# Altium footprint library Elettronica FM.PcbLib: 387 footprints (part 14 of 25)
Each footprint in its own frame and in the unit in brackets; x right, y up, seen from the top. Pads: shape width x height; smd on the part's side, far side on the other; paste and mask are expansions set on the pad; w line width, h text height; cw(c..) or ccw(c..) is an arc to the next point about the centre after c.
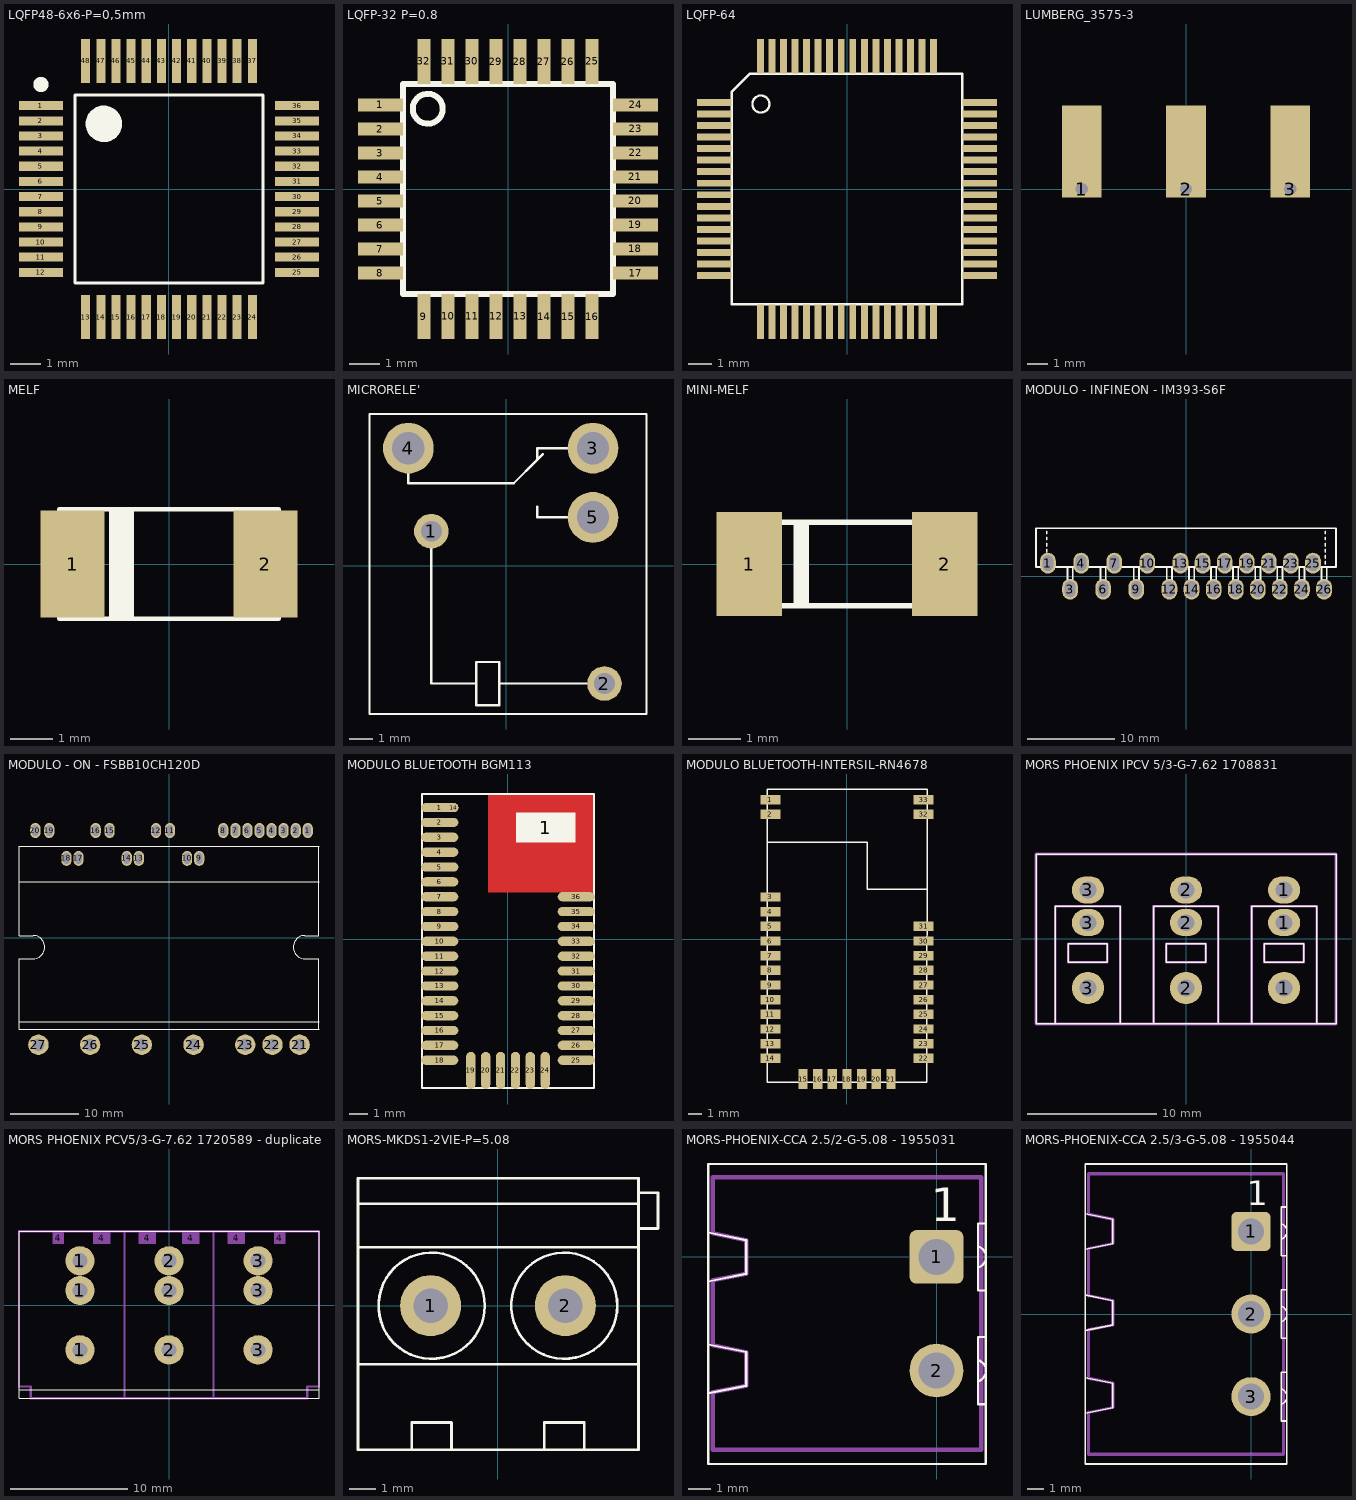
[diagram p13: the footprints below, top view; thin cyan lines are the x and y axes]

## LQFP48-6x6-P=0,5mm [mm] "QFP, 48-Leads, Body 7,00x7,00mm, Pitch 0,50mm, IPC Medium Density"
height 1.7
pads (48):
  rect 1.45x0.3 smd: 1(-4.225,2.75) 2(-4.225,2.25) 3(-4.225,1.75) 4(-4.225,1.25) 5(-4.225,0.75) 6(-4.225,0.25) 7(-4.225,-0.25) 8(-4.225,-0.75) 9(-4.225,-1.25) 10(-4.225,-1.75) 11(-4.225,-2.25) 12(-4.225,-2.75) 25(4.225,-2.75) 26(4.225,-2.25) 27(4.225,-1.75) 28(4.225,-1.25) 29(4.225,-0.75) 30(4.225,-0.25) 31(4.225,0.25) 32(4.225,0.75) 33(4.225,1.25) 34(4.225,1.75) 35(4.225,2.25) 36(4.225,2.75)
  rect 0.3x1.45 smd: 13(-2.75,-4.225) 14(-2.25,-4.225) 15(-1.75,-4.225) 16(-1.25,-4.225) 17(-0.75,-4.225) 18(-0.25,-4.225) 19(0.25,-4.225) 20(0.75,-4.225) 21(1.25,-4.225) 22(1.75,-4.225) 23(2.25,-4.225) 24(2.75,-4.225) 37(2.75,4.225) 38(2.25,4.225) 39(1.75,4.225) 40(1.25,4.225) 41(0.75,4.225) 42(0.25,4.225) 43(-0.25,4.225) 44(-0.75,4.225) 45(-1.25,4.225) 46(-1.75,4.225) 47(-2.25,4.225) 48(-2.75,4.225)
Top Overlay:
  circle w0.6: c-2.15,2.15 r0.3
  circle w0.25: c-4.225,3.45 r0.125
  lines w0.1: -3.1,-3.1 -3.1,3.1 3.1,3.1 3.1,-3.1 -3.1,-3.1
3D body: height 1.7, standoff 0.2, extent -3.5,-3.5 3.5,3.5
3D body "QFP50P900X900X160-48N.STEP": height 1.75, standoff 0, extent -4.514,-4.514 4.514,4.514

## LQFP-32 P=0.8 [mm]
height 1.9
pads (32):
  rect 1.5x0.44 smd: 1(-4.25,2.8) 2(-4.25,2) 3(-4.25,1.2) 4(-4.25,0.4) 5(-4.25,-0.4) 6(-4.25,-1.2) 7(-4.25,-2) 8(-4.25,-2.8) 17(4.25,-2.8) 18(4.25,-2) 19(4.25,-1.2) 20(4.25,-0.4) 21(4.25,0.4) 22(4.25,1.2) 23(4.25,2) 24(4.25,2.8)
  rect 0.44x1.5 smd: 9(-2.8,-4.25) 10(-2,-4.25) 11(-1.2,-4.25) 12(-0.4,-4.25) 13(0.4,-4.25) 14(1.2,-4.25) 15(2,-4.25) 16(2.8,-4.25) 25(2.8,4.25) 26(2,4.25) 27(1.2,4.25) 28(0.4,4.25) 29(-0.4,4.25) 30(-1.2,4.25) 31(-2,4.25) 32(-2.8,4.25)
Top Overlay:
  circle w0.2: c-2.675,2.675 r0.5
  lines w0.2: -3.5,-3.5 3.5,-3.5 3.5,3.5 -3.5,3.5 -3.5,-3.5
3D body: height 1.6, standoff 0, extent -3.5,-3.5 3.5,3.5

## LQFP-64 [mm]
pads (64):
  rect 1.5x0.3 smd mask+0.1: 1(-5.75,3.75) 2(-5.75,3.25) 3(-5.75,2.75) 4(-5.75,2.25) 5(-5.75,1.75) 6(-5.75,1.25) 7(-5.75,0.75) 8(-5.75,0.25) 9(-5.75,-0.25) 10(-5.75,-0.75) 11(-5.75,-1.25) 12(-5.75,-1.75) 13(-5.75,-2.25) 14(-5.75,-2.75) 15(-5.75,-3.25) 16(-5.75,-3.75) 33(5.75,-3.75) 34(5.75,-3.25) 35(5.75,-2.75) 36(5.75,-2.25) 37(5.75,-1.75) 38(5.75,-1.25) 39(5.75,-0.75) 40(5.75,-0.25) 41(5.75,0.25) 42(5.75,0.75) 43(5.75,1.25) 44(5.75,1.75) 45(5.75,2.25) 46(5.75,2.75) 47(5.75,3.25) 48(5.75,3.75)
  rect 0.3x1.5 smd mask+0.1: 17(-3.75,-5.75) 18(-3.25,-5.75) 19(-2.75,-5.75) 20(-2.25,-5.75) 21(-1.75,-5.75) 22(-1.25,-5.75) 23(-0.75,-5.75) 24(-0.25,-5.75) 25(0.25,-5.75) 26(0.75,-5.75) 27(1.25,-5.75) 28(1.75,-5.75) 29(2.25,-5.75) 30(2.75,-5.75) 31(3.25,-5.75) 32(3.75,-5.75) 49(3.75,5.75) 50(3.25,5.75) 51(2.75,5.75) 52(2.25,5.75) 53(1.75,5.75) 54(1.25,5.75) 55(0.75,5.75) 56(0.25,5.75) 57(-0.25,5.75) 58(-0.75,5.75) 59(-1.25,5.75) 60(-1.75,5.75) 61(-2.25,5.75) 62(-2.75,5.75) 63(-3.25,5.75) 64(-3.75,5.75)
Top Overlay:
  circle w0.1: c-3.731,3.681 r0.37
  lines w0.1: -5,-5 -5,4.2 -4.2,5 5,5 5,-5 -5,-5
3D body "TQFP-64.stp": height 1.6, standoff 0, extent -5.9,-5.9 5.9,5.9

## LUMBERG_3575-3 [mm]
pads (3):
  rect 1.9x4.4 hole 0.6 copper offset 0,1.8: 1(-5,0) 2(0,0) 3(5,0)
3D body "lumberg_3575_07.stp": height 7.21, standoff -2.59, extent -7.379,-1.475 27.521,13.525

## MELF [mil]
pads (2):
  rect 60x100 smd: 1(-90,0) 2(90,0)
Top Overlay:
  lines w3.94: -80.71,-51.18 -80.71,51.18 ; 80.71,-51.18 80.71,51.18 ; -102.36,-51.18 102.36,-51.18 102.36,51.18 -102.36,51.18 -102.36,-51.18
  lines w7.87: -52.17,-49.21 -52.17,49.21 ; -44.29,-49.21 -44.29,49.21 ; -36.42,-49.21 -36.42,49.21
3D body: height 51.08, standoff -51.08, extent -102.36,-50.77 102.36,51.19
3D body: height 51.47, standoff -51.47, extent -56.1,-51.37 -32.48,51.37

## MICRORELE' [mm]
height 16
pads (5):
  round 1.5 hole 0.9 mask+0.1: 1(-3.25,1.5) 2(4.25,-5.1)
  round 2.2 hole 1.4 mask+0.1: 3(3.75,5.1) 4(-4.25,5.1) 5(3.75,2.1)
Top Overlay:
  lines w0.1: -4.25,5.1 -4.25,3.58 0.32,3.58 1.332,4.593 ; -3.25,0.755 -3.25,-5.1 -1.312,-5.1 ; -0.298,-5.1 3.495,-5.1 ; 1.332,2.568 1.332,2.1 3.75,2.1 ; 1.57,4.83 1.332,4.593 ; 3.75,5.1 1.332,5.1 1.332,4.593 ; 1.332,4.593 1.332,4.593 ; -5.93,-6.42 -5.93,6.58 6.07,6.58 6.07,-6.42 -5.93,-6.42 ; -1.305,-6.045 -0.305,-6.045 -0.305,-4.17 -1.305,-4.17 -1.305,-6.045
3D body "c-1393280-6-b1-3d.stp": height 9.9, standoff -2.8, extent -5.93,-6.42 6.07,6.58

## MINI-MELF [mm]
pads (2):
  rect 1.25x2 smd: 1(-1.875,0) 2(1.875,0)
Top Overlay:
  lines w0.1: -0.975,-0.8 -0.975,0.8 ; -0.875,-0.8 -0.875,0.8 ; -0.775,-0.8 -0.775,0.8 ; -1.85,-0.8 1.85,-0.8 1.85,0.8 -1.85,0.8 -1.85,-0.8
3D body: height 1.6, standoff 0, extent -1.85,-0.794 1.85,0.8

## MODULO - INFINEON - IM393-S6F [mm]
height 1.9
pads (22):
  oval 1.8x2.4 hole 1.2 slot 1.8 at 90 deg paste-0.025 mask+0.1: 1(-15.875,1.5) 3(-13.335,-1.5) 4(-12.065,1.5) 6(-9.525,-1.5) 7(-8.255,1.5) 9(-5.715,-1.5) 10(-4.445,1.5) 12(-1.905,-1.5) 13(-0.635,1.5) 14(0.635,-1.5) 15(1.905,1.5) 16(3.175,-1.5) 17(4.445,1.5) 18(5.715,-1.5) 19(6.985,1.5) 20(8.255,-1.5) 21(9.525,1.5) 22(10.795,-1.5) 23(12.065,1.5) 24(13.335,-1.5) 25(14.605,1.5) 26(15.875,-1.5)
Top Overlay:
  lines w0.2: -16,1.375 -16,1.675 ; -16,2.075 -16,2.375 ; -16,2.775 -16,3.075 ; -16,3.475 -16,3.775 ; -16,4.175 -16,4.475 ; -16,4.875 -16,5.175 ; -13.635,1.025 -13.635,-1.75 -13.035,-1.75 -13.035,1.025 ; -9.825,1.025 -9.825,-1.75 -9.225,-1.75 -9.225,1.025 ; -6.015,1.025 -6.015,-1.75 -5.415,-1.75 -5.415,1.025 ; -2.205,1.025 -2.205,-1.75 -1.605,-1.75 -1.605,1.025 ; 0.335,1.025 0.335,-1.75 0.935,-1.75 0.935,1.025 ; 2.875,1.025 2.875,-1.75 3.475,-1.75 3.475,1.025 ; 5.415,1.025 5.415,-1.75 6.015,-1.75 6.015,1.025 ; 7.955,1.025 7.955,-1.75 8.555,-1.75 8.555,1.025 ; 10.495,1.025 10.495,-1.75 11.095,-1.75 11.095,1.025 ; 13.035,1.025 13.035,-1.75 13.635,-1.75 13.635,1.025 ; 15.575,1.025 15.575,-1.75 16.175,-1.75 16.175,1.025 ; 16,1.375 16,1.675 ; 16,2.075 16,2.375 ; 16,2.775 16,3.075 ; 16,3.475 16,3.775 ; 16,4.175 16,4.475 ; 16,4.875 16,5.175 ; -17.25,1.05 -17.25,5.5 17.25,5.5 17.25,1.05 -17.25,1.05
3D body: height 19, standoff 4, extent -17.25,1.05 17.25,5.5

## MODULO - ON - FSBB10CH120D [mm]
height 1.9
pads (27):
  oval 1.5x2.2 hole 0.9 slot 1.6 at 90 deg paste-0.025 mask+0.075: 1(20.447,15.78) 2(18.669,15.78) 3(16.891,15.78) 4(15.113,15.78) 5(13.335,15.78) 6(11.557,15.78) 7(9.779,15.78) 8(8.001,15.78) 9(4.445,11.68) 10(2.667,11.68) 11(0.136,15.78) 12(-1.914,15.78) 13(-4.445,11.68) 14(-6.223,11.68) 15(-8.754,15.78) 16(-10.804,15.78) 17(-13.335,11.68) 18(-15.113,11.68) 19(-17.644,15.78) 20(-19.694,15.78)
  round 3 hole 1.8 paste-0.025 mask+0.075: 21(19.24,-15.78) 22(15.24,-15.78) 23(11.24,-15.78) 24(3.62,-15.78) 25(-4,-15.78) 26(-11.62,-15.78) 27(-19.24,-15.78)
Top Overlay:
  lines w0.1: -22.1,-12.4 22.1,-12.4 ; -22.1,8.2 22.1,8.2 ; -22.1,-13.5 22.1,-13.5 22.1,-3.1 20,-3.1 cw(c20,-1.4) 20,0.3 22.1,0.3 22.1,13.5 -22.1,13.5 -22.1,0.3 -20,0.3 cw(c-20,-1.4) -20,-3.1 -22.1,-3.1 -22.1,-13.5
3D body: height 7.51, standoff 7.49, extent -17.3,-10.4 17.3,2.6
3D body: height 5.6, standoff 1.8, extent -22.1,-13.5 22.1,13.5
3D body: height 7.5, standoff 1.8, extent -22.1,-12.4 22.1,8.2

## MODULO BLUETOOTH BGM113 [mm]
pads (38):
  oval 2x0.5 smd mask+0.1: 1(-3.675,7.075) 2(-3.675,6.275) 3(-3.675,5.475) 4(-3.675,4.675) 5(-3.675,3.875) 6(-3.675,3.075) 7(-3.675,2.275) 8(-3.675,1.475) 9(-3.675,0.675) 10(-3.675,-0.125) 11(-3.675,-0.925) 12(-3.675,-1.725) 13(-3.675,-2.525) 14(-3.675,-3.325) 15(-3.675,-4.125) 16(-3.675,-4.925) 17(-3.675,-5.725) 18(-3.675,-6.525) 25(3.675,-6.525) 26(3.675,-5.725) 27(3.675,-4.925) 28(3.675,-4.125) 29(3.675,-3.325) 30(3.675,-2.525) 31(3.675,-1.725) 32(3.675,-0.925) 33(3.675,-0.125) 34(3.675,0.675) 35(3.675,1.475) 36(3.675,2.275)
  rect 3.2x1.6 on Top Overlay mask+0.1: 1(2.025,6)
  round 0.5 on Top Overlay mask+0.1: 14(-2.925,7.075)
  oval 0.5x2 smd mask+0.1: 19(-2,-7.075) 20(-1.2,-7.075) 21(-0.4,-7.075) 22(0.4,-7.075) 23(1.2,-7.075) 24(2,-7.075)
Top Layer:
  pour cut-out: -1.075,7.8 -1.075,2.525 4.625,2.525 4.625,7.8
Top Overlay:
  lines w0.1: -4.625,-8.025 4.625,-8.025 4.625,7.8 -4.625,7.8 -4.625,-8.025
3D body: height 2, standoff 0.6, extent -4.625,-8.025 4.625,2.7
3D body: height 0.6, standoff 0, extent -4.625,-8.025 4.625,7.8
3D body: height 1.4, standoff 0.6, extent 0.425,5.2 3.625,6.8

## MODULO BLUETOOTH-INTERSIL-RN4678 [mm]
pads (33):
  rect 1.5x0.7 smd mask+0.1: 1(-5.75,10.475) 2(-5.75,9.375) 3(-5.75,3.175) 4(-5.75,2.075) 5(-5.75,0.975) 6(-5.75,-0.125) 7(-5.75,-1.225) 8(-5.75,-2.325) 9(-5.75,-3.425) 10(-5.75,-4.525) 11(-5.75,-5.625) 12(-5.75,-6.725) 13(-5.75,-7.825) 14(-5.75,-8.925) 22(5.75,-8.925) 23(5.75,-7.825) 24(5.75,-6.725) 25(5.75,-5.625) 26(5.75,-4.525) 27(5.75,-3.425) 28(5.75,-2.325) 29(5.75,-1.225) 30(5.75,-0.125) 31(5.75,0.975) 32(5.75,9.375) 33(5.75,10.475)
  rect 0.7x1.5 smd mask+0.1: 15(-3.3,-10.475) 16(-2.2,-10.475) 17(-1.1,-10.475) 18(0,-10.475) 19(1.1,-10.475) 20(2.2,-10.475) 21(3.3,-10.475)
Top Overlay:
  lines w0.1: -6,7.275 1.5,7.275 1.5,3.775 6,3.775 ; -6,-10.725 -6,11.275 6,11.275 6,-10.725 -6,-10.725
3D body: height 2.4, standoff 0, extent -6,-10.725 6,11.275

## MORS PHOENIX IPCV 5/3-G-7.62 1708831 [mm]
pads (9):
  round 2.5 hole 1.3: 1(7.62,-3.81) 2(0,-3.81) 3(-7.62,-3.81)
  oval 2.5x2.1 hole 1.3: 1(7.62,1.27) 1(7.62,3.81) 2(0,1.27) 2(0,3.81) 3(-7.62,1.27) 3(-7.62,3.81)
Top Overlay:
  lines w0.1: -10.15,-6.6 -10.15,2.55 -5.1,2.55 -5.1,-6.6 ; -2.52,-6.6 -2.52,2.55 2.52,2.55 2.52,-6.6 ; 5.1,-6.6 5.1,2.55 10.14,2.55 10.14,-6.6 ; -11.65,-6.6 -11.65,6.6 11.65,6.6 11.65,-6.6 -11.65,-6.6 ; -9.15,-1.8 -6.1,-1.8 -6.1,-0.375 -9.15,-0.375 -9.15,-1.8 ; -1.53,-1.8 -1.53,-0.375 1.52,-0.375 1.52,-1.8 -1.53,-1.8 ; 6.09,-1.8 6.09,-0.375 9.14,-0.375 9.14,-1.8 6.09,-1.8
Mechanical 32:
  lines w0.2: -10.15,-6.6 -10.15,2.55 -5.1,2.55 -5.1,-6.6 ; -2.53,-6.6 -2.53,2.55 2.52,2.55 2.52,-6.6 ; 5.09,-6.6 5.09,2.55 10.14,2.55 10.14,-6.6 ; -11.65,-6.6 11.65,-6.6 11.65,6.6 -11.65,6.6 -11.65,-6.6 ; -9.15,-1.8 -9.15,-0.375 -6.1,-0.375 -6.1,-1.8 -9.15,-1.8 ; -1.53,-1.8 1.52,-1.8 1.52,-0.375 -1.53,-0.375 -1.53,-1.8 ; 6.09,-1.8 9.14,-1.8 9.14,-0.375 6.09,-0.375 6.09,-1.8
3D body "pxc_1708831_03_IPCV-5-3-G-7-62_3D (1).stp": height 30.1, standoff -5, extent -11.43,-6.4 11.43,6.4

## MORS PHOENIX PCV5/3-G-7.62 1720589 - duplicate [mm]
pads (15):
  round 2.5 hole 1.3: 1(-7.62,-3.81) 1(-7.62,1.27) 1(-7.62,3.81) 2(0,-3.81) 2(0,1.27) 2(0,3.81) 3(7.62,-3.81) 3(7.62,1.27) 3(7.62,3.81)
  rect 1x1 on Mech32 mask+0.1: 4(-9.47,5.725) 4(9.47,5.725)
  rect 1.5x1 on Mech32 mask+0.1: 4(-5.77,5.725) 4(-1.85,5.725) 4(1.85,5.725) 4(5.77,5.725)
Top Overlay:
  lines w0.1: -12.83,-7.21 12.83,-7.21 ; -12.83,-7.21 -12.83,6.33 12.83,6.33 12.83,-7.21 ; -12.83,-7.21 -12.83,-7.96 12.83,-7.96 12.83,-7.21
Mechanical 32:
  lines w0.2: -3.8,-7.95 -3.8,6.325 ; 3.8,-7.95 3.8,6.325 ; -12.825,-6.95 -12.825,6.325 12.825,6.325 12.825,-6.95 11.825,-6.95 11.825,-7.95 -11.825,-7.95 -11.825,-6.95 -12.825,-6.95
3D body "1720589_02.stp": height 29.2, standoff -5.05, extent -12.83,-7.95 12.83,6.34

## MORS-MKDS1-2VIE-P=5.08 [mm]
height 1.9
pads (2):
  round 2.3 hole 1.3: 1(-2.54,0) 2(2.54,0)
Top Overlay:
  circle w0.1: c2.5,0 r2
  circle w0.1: c-2.5,0 r2
  lines w0.1: -5.275,-2.2 5.3,-2.2 ; -5.275,2.2 5.3,2.2 ; -5.275,3.837 5.3,3.837 ; -3.25,-5.425 -3.25,-4.4 -1.75,-4.4 -1.75,-5.425 ; 1.75,-5.425 1.75,-4.4 3.25,-4.4 3.25,-5.425 ; 5.3,2.912 6.033,2.912 6.033,4.262 5.3,4.262 ; -5.275,-5.425 -5.275,4.8 5.3,4.8 5.3,-5.425 -5.275,-5.425
3D body "1715721.stp": height 14.2, standoff -3.5, extent -5.067,-5.213 5.834,4.587

## MORS-PHOENIX-CCA 2.5/2-G-5.08 - 1955031 [mm]
height 4.8
pads (2):
  rrect25% 2.4x2.4 hole 1.6: 1(0,0)
  round 2.4 hole 1.6: 2(0,-5.08)
Top Overlay:
  lines w0.1: -10.202,-6.095 -8.5,-5.755 -8.5,-4.255 -10.202,-3.915 ; -10.202,-1.095 -8.5,-0.755 -8.5,0.745 -10.202,1.085 ; -0.504,-5.571 cw(c-0.004,-5.081) -0.504,-4.592 ; -0.504,-0.491 cw(c-0.004,-0.001) -0.504,0.488 ; -0.494,-5.581 ccw(c-0.004,-5.081) 0.486,-5.581 ; -0.494,-4.581 cw(c-0.004,-5.081) 0.486,-4.581 ; -0.494,-0.501 ccw(c-0.004,-0.001) 0.486,-0.501 ; -0.494,0.499 cw(c-0.004,-0.001) 0.486,0.499 ; 0.496,-5.571 ccw(c-0.004,-5.081) 0.496,-4.592 ; 0.496,-0.491 ccw(c-0.004,-0.001) 0.496,0.488 ; 2.2,-5.132 2.2,-6.585 ; 2.2,-5.038 2.2,-3.585 ; 2.2,-0.052 2.2,-1.505 ; 2.2,0.042 2.2,1.495 ; 1.85,-5.562 ccw(c1.703,-5.085) 1.85,-4.608 ; 1.85,-5.562 1.85,-4.608 ; 1.85,-5.562 1.85,-6.585 2.2,-6.585 ; 1.85,-4.608 1.85,-3.585 2.2,-3.585 ; 1.85,-0.482 ccw(c1.703,-0.005) 1.85,0.472 ; 1.85,-0.482 1.85,-1.505 2.2,-1.505 ; 1.85,-0.482 1.85,0.472 ; 1.85,0.472 1.85,1.495 2.2,1.495 ; 2.2,-6.585 2.2,-9.25 -10.2,-9.253 -10.2,4.15 2.2,4.15 2.2,1.495 ; 2.2,-3.585 2.2,-1.505
  text "1" at -0.25,1.6 h1.5
Mechanical 1:
  lines w0.013: 0.504,3.501 1.254,3.501
Mechanical 32:
  lines w0.2: -10,-8.625 2,-8.625 2,3.55 -10,3.55 -10,1.05 -8.5,0.75 -8.5,-0.75 -10,-1.05 -10,-3.95 -8.5,-4.25 -8.5,-5.75 -10,-6.05 -10,-8.625
3D body "pxc_1955031_04_CCA-2-5-2-G-5-08-P26THRR32_3D.stp": height 8.57, standoff -2.6, extent -10.002,-9.02 1.998,3.94

## MORS-PHOENIX-CCA 2.5/3-G-5.08 - 1955044 [mm]
height 4.8
pads (3):
  rrect25% 2.4x2.4 hole 1.6: 1(0,5.08)
  round 2.4 hole 1.6: 2(0,0) 3(0,-5.08)
Top Overlay:
  lines w0.1: -10.203,-3.914 -8.5,-4.255 -8.5,-5.755 -10.201,-6.095 ; -10.202,-1.015 -8.5,-0.675 -8.5,0.825 -10.202,1.165 ; -10.202,3.985 -8.5,4.325 -8.5,5.825 -10.202,6.165 ; -0.504,-5.571 cw(c-0.004,-5.081) -0.504,-4.592 ; -0.504,-0.491 cw(c-0.004,-0.001) -0.504,0.488 ; -0.504,4.589 cw(c-0.004,5.079) -0.504,5.568 ; -0.494,-5.581 ccw(c-0.004,-5.081) 0.486,-5.581 ; -0.494,-4.581 cw(c-0.004,-5.081) 0.486,-4.581 ; -0.494,-0.501 ccw(c-0.004,-0.001) 0.486,-0.501 ; -0.494,0.499 cw(c-0.004,-0.001) 0.486,0.499 ; -0.494,4.579 ccw(c-0.004,5.079) 0.486,4.579 ; -0.494,5.579 cw(c-0.004,5.079) 0.486,5.579 ; 0.496,-5.571 ccw(c-0.004,-5.081) 0.496,-4.592 ; 0.496,-0.491 ccw(c-0.004,-0.001) 0.496,0.488 ; 0.496,4.589 ccw(c-0.004,5.079) 0.496,5.568 ; 2.2,-5.129 2.2,-6.581 ; 2.2,-5.034 2.2,-3.581 ; 2.2,-0.049 2.2,-1.501 ; 2.2,0.046 2.2,1.499 ; 2.2,5.031 2.2,3.579 ; 2.2,5.126 2.2,6.579 ; 1.85,-5.558 ccw(c1.703,-5.081) 1.85,-4.604 ; 1.85,-5.558 1.85,-6.581 2.2,-6.581 ; 1.85,-5.558 1.85,-4.604 ; 1.85,-4.604 1.85,-3.581 2.2,-3.581 ; 1.85,-0.478 ccw(c1.703,-0.001) 1.85,0.476 ; 1.85,-0.478 1.85,0.476 ; 1.85,-0.478 1.85,-1.501 2.2,-1.501 ; 1.85,0.476 1.85,1.499 2.2,1.499 ; 1.85,4.602 ccw(c1.703,5.079) 1.85,5.556 ; 1.85,4.602 1.85,3.579 2.2,3.579 ; 1.85,4.602 1.85,5.556 ; 1.85,5.556 1.85,6.579 2.2,6.579 ; 2.2,-6.581 2.2,-9.225 -10.2,-9.225 -10.2,9.225 2.2,9.225 2.2,6.579 ; 2.2,-3.581 2.2,-1.501 ; 2.2,1.499 2.2,3.579
  text "1" at -0.25,6.68 h1.5
Mechanical 1:
  lines w0.013: 0.504,8.581 1.254,8.581
Mechanical 32:
  lines w0.2: -10,-8.625 2,-8.625 2,8.63 -10,8.63 -10,6.13 -8.5,5.83 -8.5,4.33 -10,4.03 -10,1.13 -8.5,0.83 -8.5,-0.67 -10,-0.97 -10,-3.95 -8.5,-4.25 -8.5,-5.75 -10,-6.05 -10,-8.625
3D body "pxc_1955044_04_CCA-2-5-3-G-5-08-P26THRR32_3D.stp": height 8.57, standoff -2.6, extent -10,-9.02 2,9.02